# Altium footprint library Angler.PcbLib: 331 footprints (part 13 of 21)
Each footprint in its own frame and in the unit in brackets; x right, y up, seen from the top. Pads: shape width x height; smd on the part's side, far side on the other; paste and mask are expansions set on the pad; w line width, h text height; cw(c..) or ccw(c..) is an arc to the next point about the centre after c.
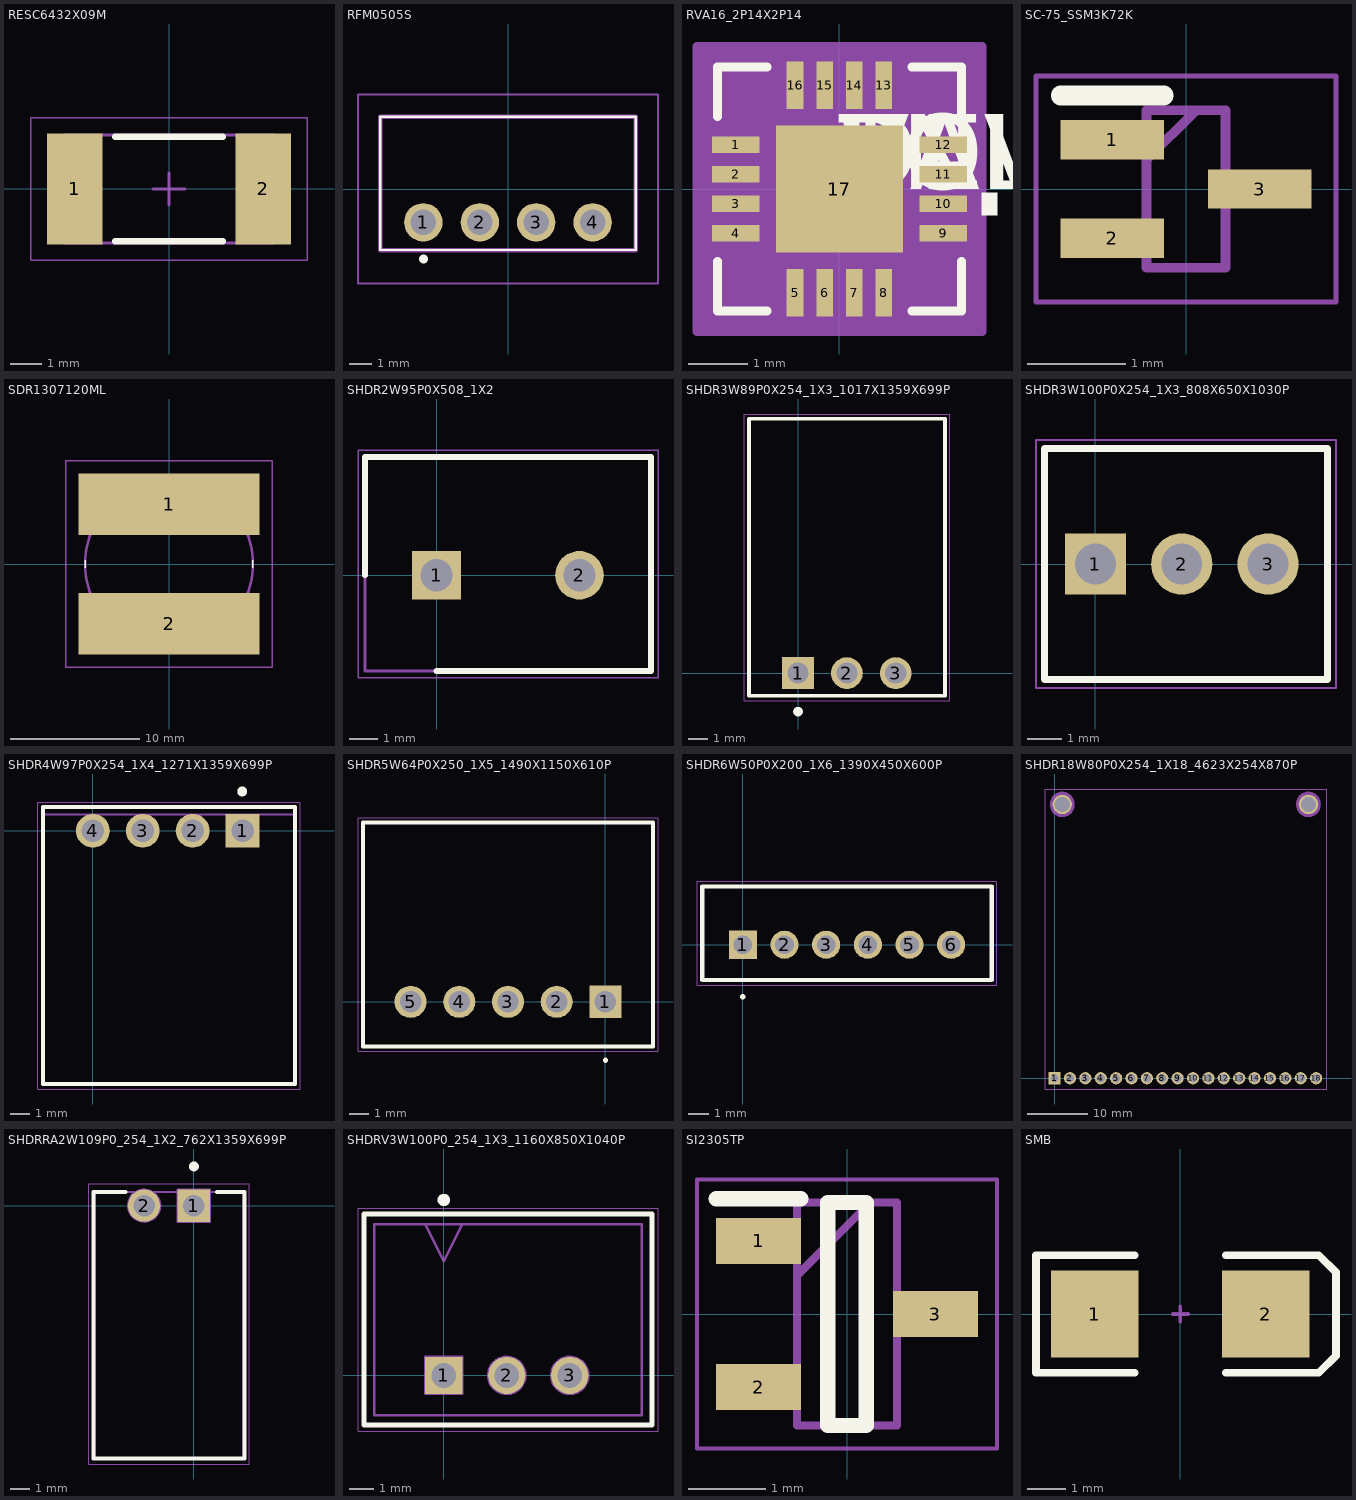
[diagram p12: the footprints below, top view; thin cyan lines are the x and y axes]

## RESC6432X09M [mm] "Chip Resistor, 2-Leads, Body 6.40x3.20mm, IPC Low Density (2512)"
height 0.9
pads (2):
  rect 1.75x3.5 smd: 1(-2.975,0) 2(2.975,0)
Top Overlay:
  lines w0.2: -1.7,-1.65 1.7,-1.65 ; -1.7,1.65 1.7,1.65
Mechanical 13:
  lines w0.1: -3.3,-1.7 3.3,-1.7 3.3,1.7 -3.3,1.7 -3.3,-1.7
Mechanical 15:
  lines w0.05: -4.35,-2.25 4.35,-2.25 4.35,2.25 -4.35,2.25 -4.35,-2.25
  lines w0.1: -0.5,0 0.5,0 ; 0,-0.5 0,0.5
3D body "RESC6432X09M.step": height 0.9, standoff 0, extent -3.3,-1.7 3.3,1.7

## RFM0505S [mm]
pads (4):
  round 1.725 hole 1.15: 1(-3.81,-1.5) 2(-1.27,-1.5) 3(1.27,-1.5) 4(3.81,-1.5)
Top Overlay:
  lines w0.1: -5.75,-2.75 -5.75,3.25 5.75,3.25 5.75,-2.75 -5.75,-2.75
  lines w0.2: -3.9,-3.15 ccw(c-3.8,-3.15) -3.7,-3.15 ccw(c-3.8,-3.15) -3.9,-3.15
Mechanical 13:
  lines w0.2: -5.75,-2.75 -5.75,3.25 5.75,3.25 5.75,-2.75 -5.75,-2.75
Mechanical 15:
  lines w0.1: -6.75,-4.25 -6.75,4.25 6.75,4.25 6.75,-4.25 -6.75,-4.25
3D body "RFM-0505S.stp": height 10, standoff -5, extent -5.75,-2.75 5.75,3.25

## RVA16_2P14X2P14 [mm]
pads (17):
  rect 0.8x0.28 smd paste-0.14: 1(-1.75,0.75) 2(-1.75,0.25) 3(-1.75,-0.25) 4(-1.75,-0.75) 9(1.75,-0.75) 10(1.75,-0.25) 11(1.75,0.25) 12(1.75,0.75)
  rect 0.28x0.8 smd paste-0.14: 5(-0.75,-1.75) 6(-0.25,-1.75) 7(0.25,-1.75) 8(0.75,-1.75) 13(0.75,1.75) 14(0.25,1.75) 15(-0.25,1.75) 16(-0.75,1.75)
  rect 2.14x2.14 smd paste-1.057 mask-1.054: 17(0,0)
Top Overlay:
  region: 2.404,-0.059 2.658,-0.059 2.658,-0.44 2.404,-0.44
  lines w0.152: -2.057,-1.223 -2.057,-2.057 -1.223,-2.057 ; -2.057,1.223 -2.057,2.057 -1.223,2.057 ; 1.223,-2.057 2.057,-2.057 2.057,-1.223 ; 1.223,2.057 2.057,2.057 2.057,1.223
  text "TOL" at 0,0 h1.27
  text "VAL" at 0,0 h1.27
  text "DEV" at 0,0 h1.27
  text "PN" at 0,0 h1.27
Top Paste:
  region: 0.995,-0.494 0.635,-0.494 0.494,-0.635 0.494,-0.995 0.995,-0.995
  region: 0.995,0.294 0.635,0.294 0.494,0.152 0.494,-0.152 0.635,-0.294 0.995,-0.294
  region: 0.995,0.995 0.494,0.995 0.494,0.635 0.635,0.494 0.995,0.494
  region: 0.152,-0.494 -0.152,-0.494 -0.294,-0.635 -0.294,-0.995 0.294,-0.995 0.294,-0.635
  region: 0.152,0.294 -0.152,0.294 -0.294,0.152 -0.294,-0.152 -0.152,-0.294 0.152,-0.294 0.294,-0.152 0.294,0.152
  region: 0.294,0.995 -0.294,0.995 -0.294,0.635 -0.152,0.494 0.152,0.494 0.294,0.635
  region: -0.635,-0.494 -0.995,-0.494 -0.995,-0.995 -0.494,-0.995 -0.494,-0.635
  region: -0.635,0.294 -0.995,0.294 -0.995,-0.294 -0.635,-0.294 -0.494,-0.152 -0.494,0.152
  region: -0.494,0.995 -0.995,0.995 -0.995,0.494 -0.635,0.494 -0.494,0.635
  region: -0.635,2.125 -0.865,2.125 -0.865,1.375 -0.635,1.375
  region: -0.135,2.125 -0.365,2.125 -0.365,1.375 -0.135,1.375
  region: 0.365,2.125 0.135,2.125 0.135,1.375 0.365,1.375
  region: 0.865,2.125 0.635,2.125 0.635,1.375 0.865,1.375
  region: 2.125,0.865 1.375,0.865 1.375,0.635 2.125,0.635
  region: 2.125,0.365 1.375,0.365 1.375,0.135 2.125,0.135
  region: 2.125,-0.135 1.375,-0.135 1.375,-0.365 2.125,-0.365
  region: 2.125,-0.635 1.375,-0.635 1.375,-0.865 2.125,-0.865
  region: 0.865,-1.375 0.635,-1.375 0.635,-2.125 0.865,-2.125
  region: 0.365,-1.375 0.135,-1.375 0.135,-2.125 0.365,-2.125
  region: -0.135,-1.375 -0.365,-1.375 -0.365,-2.125 -0.135,-2.125
  region: -0.635,-1.375 -0.865,-1.375 -0.865,-2.125 -0.635,-2.125
  region: -1.375,-0.635 -2.125,-0.635 -2.125,-0.865 -1.375,-0.865
  region: -1.375,-0.135 -2.125,-0.135 -2.125,-0.365 -1.375,-0.365
  region: -1.375,0.365 -2.125,0.365 -2.125,0.135 -1.375,0.135
  region: -1.375,0.865 -2.125,0.865 -2.125,0.635 -1.375,0.635
Top Solder:
  region: 0.594,-1.134 0.594,1.134 1.134,1.134 1.134,-1.134
  region: 0.194,-1.134 0.194,1.134 -0.194,1.134 -0.194,-1.134
  region: -1.134,-1.134 -1.134,1.134 -0.594,1.134 -0.594,-1.134
  region: -1.134,-1.134 -1.134,-0.594 1.134,-0.594 1.134,-1.134
  region: -1.134,-0.194 -1.134,0.194 1.134,0.194 1.134,-0.194
  region: -1.134,0.594 -1.134,1.134 1.134,1.134 1.134,0.594
  region: -0.54,2.22 -0.96,2.22 -0.96,1.28 -0.54,1.28
  region: -0.04,2.22 -0.46,2.22 -0.46,1.28 -0.04,1.28
  region: 0.46,2.22 0.04,2.22 0.04,1.28 0.46,1.28
  region: 0.96,2.22 0.54,2.22 0.54,1.28 0.96,1.28
  region: 2.22,0.96 1.28,0.96 1.28,0.54 2.22,0.54
  region: 2.22,0.46 1.28,0.46 1.28,0.04 2.22,0.04
  region: 2.22,-0.04 1.28,-0.04 1.28,-0.46 2.22,-0.46
  region: 2.22,-0.54 1.28,-0.54 1.28,-0.96 2.22,-0.96
  region: 0.96,-1.28 0.54,-1.28 0.54,-2.22 0.96,-2.22
  region: 0.46,-1.28 0.04,-1.28 0.04,-2.22 0.46,-2.22
  region: -0.04,-1.28 -0.46,-1.28 -0.46,-2.22 -0.04,-2.22
  region: -0.54,-1.28 -0.96,-1.28 -0.96,-2.22 -0.54,-2.22
  region: -1.28,-0.54 -2.22,-0.54 -2.22,-0.96 -1.28,-0.96
  region: -1.28,-0.04 -2.22,-0.04 -2.22,-0.46 -1.28,-0.46
  region: -1.28,0.46 -2.22,0.46 -2.22,0.04 -1.28,0.04
  region: -1.28,0.96 -2.22,0.96 -2.22,0.54 -1.28,0.54
Mechanical 13:
  text "RefDes2" at 0,0 h1.27
Mechanical 15:
  region: 2.404,-2.404 -2.404,-2.404 -2.404,2.404 2.404,2.404
  lines w0.152: -2.404,-2.404 2.404,-2.404 2.404,2.404 -2.404,2.404 -2.404,-2.404
3D body "RVA16_2P14X2P14.stp": height 1.4, standoff 0, extent -1.854,-1.854 1.854,1.854

## SC-75_SSM3K72K [mm]
height 0.7
pads (3):
  rect 1.05x0.4 smd: 1(-0.75,0.5) 2(-0.75,-0.5) 3(0.75,0)
Top Overlay:
  lines w0.2: -1.275,0.95 -0.225,0.95
Mechanical 13:
  lines w0.1: -0.4,0.3 0.1,0.8 ; -0.4,-0.8 0.4,-0.8 0.4,0.8 -0.4,0.8 -0.4,-0.8
Mechanical 15:
  lines w0.05: -1.525,-1.15 1.525,-1.15 1.525,1.15 -1.525,1.15 -1.525,-1.15
3D body "PMR280UN,115.stp": height 0.95, standoff 0, extent -0.8,-0.8 0.8,0.8

## SDR1307120ML [mm]
pads (2):
  rect 14x4.75 smd: 1(0,4.625) 2(0,-4.625)
Top Overlay:
  lines w0.1: -6.5,-0.3 -6.5,0.3 ; 6.5,-0.3 6.5,0.3
Mechanical 13:
  lines w0.2: -6.5,0 ccw(c0,0) 6.5,0 ccw(c0,0) -6.5,0
Mechanical 15:
  lines w0.1: -8,-8 -8,8 8,8 8,-8 -8,-8
3D body "SDR1307_colour.STP": height 7, standoff 0, extent -6.5,-6.5 6.5,6.5

## SHDR2W95P0X508_1X2 [mm]
height 10
pads (2):
  rect 1.725x1.725 hole 1.15: 1(0,0)
  round 1.725 hole 1.15: 2(5.08,0)
Top Overlay:
  lines w0.2: -2.54,0 -2.54,4.2 7.62,4.2 7.62,-3.4 0,-3.4
Mechanical 13:
  lines w0.1: -2.54,-3.4 -2.54,4.2 7.62,4.2 7.62,-3.4 -2.54,-3.4
Mechanical 15:
  lines w0.05: -2.79,-3.65 -2.79,4.45 7.87,4.45 7.87,-3.65 -2.79,-3.65
3D body "1715721.STEP": height 14.2, standoff -3.5, extent -2.551,-5.2 8.351,4.6

## SHDR3W89P0X254_1X3_1017X1359X699P [mm]
pads (3):
  rect 1.65x1.65 hole 1.1: 1(0,0)
  round 1.65 hole 1.1: 2(2.54,0) 3(5.08,0)
Top Overlay:
  circle w0.25: c0,-2 r0.125
  lines w0.2: -2.54,-1.175 -2.54,13.21 7.63,13.21 7.63,-1.175 -2.54,-1.175
Mechanical 13:
  lines w0.1: -2.54,-1.2 7.63,-1.2 7.63,13.21 -2.54,13.21 -2.54,-1.175
Mechanical 15:
  lines w0.05: -2.79,-1.425 7.88,-1.425 7.88,13.46 -2.79,13.46 -2.79,-1.425
3D body "70553-0002.stp": height 7.06, standoff -3.22, extent -2.56,-0.7 7.6,12.889

## SHDR3W100P0X254_1X3_808X650X1030P [mm]
pads (3):
  rect 1.8x1.8 hole 1.2: 1(0,0)
  round 1.8 hole 1.2: 2(2.54,0) 3(5.08,0)
Top Overlay:
  lines w0.2: -1.5,-3.4 6.83,-3.4 6.83,3.4 -1.5,3.4 -1.5,-3.4
Mechanical 13:
  lines w0.1: -1.5,-3.4 -1.5,3.4 6.83,3.4 6.83,-3.4 -1.5,-3.4
Mechanical 15:
  lines w0.05: -1.75,-3.65 -1.75,3.65 7.08,3.65 7.08,-3.65 -1.75,-3.65
3D body "282834-3.stp": height 10, standoff -3.4, extent -1.5,-3.25 6.58,3.25

## SHDR4W97P0X254_1X4_1271X1359X699P [mm]
pads (4):
  rect 1.725x1.725 hole 1.15: 1(7.62,0)
  round 1.725 hole 1.15: 2(5.08,0) 3(2.54,0) 4(0,0)
Top Overlay:
  circle w0.25: c7.6,2 r0.125
  lines w0.2: -2.545,1.2 -2.545,-12.895 10.295,-12.895 10.295,1.212 -2.545,1.212
Mechanical 13:
  lines w0.1: -2.545,-12.895 10.295,-12.895 10.295,0.825 -2.545,0.825 -2.545,-12.895
Mechanical 15:
  lines w0.05: -2.795,-13.145 10.545,-13.145 10.545,1.462 -2.795,1.462 -2.795,-13.145
3D body "70553-0003.stp": height 7.06, standoff -3.22, extent -2.55,-12.889 10.15,0.7

## SHDR5W64P0X250_1X5_1490X1150X610P [mm]
pads (5):
  rect 1.65x1.65 hole 1.1: 1(0,0)
  round 1.65 hole 1.1: 2(-2.5,0) 3(-5,0) 4(-7.5,0) 5(-10,0)
Top Overlay:
  circle w0.254: c-0.002,-3 r0.002
  lines w0.2: -12.45,-2.3 2.45,-2.3 2.45,9.2 -12.45,9.2 -12.45,-2.3
Mechanical 13:
  lines w0.1: -12.45,-2.3 2.45,-2.3 2.45,9.2 -12.45,9.2 -12.45,-2.3
Mechanical 15:
  lines w0.05: -12.7,-2.55 2.7,-2.55 2.7,9.45 -12.7,9.45 -12.7,-2.55
3D body "S5B-XH-A.STEP": height 6.15, standoff -3.4, extent -12.45,-2.35 2.45,9.15

## SHDR6W50P0X200_1X6_1390X450X600P [mm]
pads (6):
  rect 1.35x1.35 hole 0.9: 1(0,0)
  round 1.35 hole 0.9: 2(2,0) 3(4,0) 4(6,0) 5(8,0) 6(10,0)
Top Overlay:
  circle w0.254: c0,-2.5 r0.002
  lines w0.2: -1.95,-1.7 11.95,-1.7 11.95,2.8 -1.95,2.8 -1.95,-1.7
Mechanical 13:
  lines w0.1: -1.95,-1.7 -1.95,2.8 11.95,2.8 11.95,-1.7 -1.95,-1.7
Mechanical 15:
  lines w0.05: -2.2,-1.95 -2.2,3.05 12.2,3.05 12.2,-1.95 -2.2,-1.95
3D body "B6B-PH-K-S.STEP": height 6, standoff -3.4, extent -2,-1.65 11.9,2.85

## SHDR18W80P0X254_1X18_4623X254X870P [mm]
pads (20):
  rect 2.025x2.025 hole 1.35: 1(0,0)
  round 2.025 hole 1.35: 2(2.54,0) 3(5.08,0) 4(7.62,0) 5(10.16,0) 6(12.7,0) 7(15.24,0) 8(17.78,0) 9(20.32,0) 10(22.86,0) 11(25.4,0) 12(27.94,0) 13(30.48,0) 14(33.02,0) 15(35.56,0) 16(38.1,0) 17(40.64,0) 18(43.18,0)
  round 3.2 hole 2.5: ""(1.27,45.212) ""(41.91,45.212)
Mechanical 2:
  circle w0.203: c41.91,45.212 r2
  circle w0.203: c1.27,45.212 r2
Mechanical 13:
  lines w0.1: -1.52,-1.778 44.92,-1.778 44.92,47.752 -1.52,47.752 -1.52,-1.778
Mechanical 34:
  circle w2.032: c41.91,45.212 r1
  circle w2.032: c1.27,45.212 r1
Mechanical 35:
  circle w2.032: c41.91,45.212 r1
  circle w2.032: c1.27,45.212 r1
3D body "ADAFRUIT.step": height 10.16, standoff 8.57, extent -1.295,-1.829 44.425,47.701
3D body "_ _ _C181LFBN-RC.STEP": height 8.5, standoff -3.2, extent -1.52,-1.27 44.7,1.27

## SHDRRA2W109P0_254_1X2_762X1359X699P [mm]
pads (2):
  rect 1.65x1.65 hole 1.1: 1(0,0)
  round 1.65 hole 1.1: 2(-2.54,0)
Top Overlay:
  circle w0.25: c0,2 r0.125
  lines w0.2: -3.48,0.705 -5.12,0.705 -5.12,-12.895 2.58,-12.895 2.58,0.705 1.175,0.705
Mechanical 13:
  circle w0.1: c-2.54,0 r0.825
  lines w0.1: -0.825,0.7 0,0.225 0.825,0.7 ; -5.08,-12.89 -5.08,0.7 2.54,0.7 2.54,-12.89 -5.08,-12.89 ; -0.825,-0.825 0.825,-0.825 0.825,0.825 -0.825,0.825 -0.825,-0.825
Mechanical 15:
  circle w0.05: c0,0 r0.35
  lines w0.001: -5.08,-12.89 -5.08,0.7 2.54,0.7 2.54,-12.89 -5.08,-12.89
  lines w0.05: -0.5,0 0.5,0 ; 0,-0.5 0,0.5 ; -5.37,-13.183 -5.37,1.118 2.83,1.118 2.83,-13.183 -5.37,-13.183
3D body "70553-0001.stp": height 7.06, standoff -3.22, extent -4.966,-12.889 2.4,0.7

## SHDRV3W100P0_254_1X3_1160X850X1040P [mm]
pads (3):
  rect 1.5x1.5 hole 1: 1(0,0)
  round 1.5 hole 1: 2(2.54,0) 3(5.08,0)
Top Overlay:
  circle w0.25: c0,7.075 r0.125
  lines w0.2: -3.21,-2 -3.21,6.5 8.39,6.5 8.39,-2 -3.21,-2
Mechanical 13:
  circle w0.1: c5.08,0 r0.75
  circle w0.1: c2.54,0 r0.75
  lines w0.1: -0.75,6.1 0,4.6 0.75,6.1 ; -3.21,-2 -3.21,6.5 8.39,6.5 8.39,-2 -3.21,-2 ; -2.81,-1.6 -2.81,6.1 7.99,6.1 7.99,-1.6 -2.81,-1.6 ; -0.75,-0.75 0.75,-0.75 0.75,0.75 -0.75,0.75 -0.75,-0.75
Mechanical 15:
  circle w0.05: c0,0 r0.35
  lines w0.001: -3.21,-2 -3.21,6.5 8.39,6.5 8.39,-2 -3.21,-2
  lines w0.05: -0.5,0 0.5,0 ; 0,-0.5 0,0.5 ; -3.46,-2.25 -3.46,6.75 8.64,6.75 8.64,-2.25 -3.46,-2.25
3D body "R-78E5.0-0.5--3DModel-STEP-56544.STEP": height 10.4, standoff -4.1, extent -3.26,-2.09 8.34,6.41

## SI2305TP [mm]
pads (3):
  rect 1.1x0.6 smd: 1(-1.15,0.95) 2(-1.15,-0.95) 3(1.15,0)
Top Overlay:
  lines w0.2: -1.7,1.5 -0.6,1.5 ; -0.25,-1.45 0.25,-1.45 0.25,1.45 -0.25,1.45 -0.25,-1.45
Mechanical 13:
  lines w0.1: -0.65,0.5 0.3,1.45 ; -0.65,-1.45 0.65,-1.45 0.65,1.45 -0.65,1.45 -0.65,-1.45
Mechanical 15:
  lines w0.05: -1.95,-1.75 1.95,-1.75 1.95,1.75 -1.95,1.75 -1.95,-1.75
3D body "BSS138NH6327.stp": height 1.1, standoff 0, extent -1.3,-1.45 1.3,1.45

## SMB [mm] "DO-214-AA/SMB; 2 C-Bend Leads; Body 5.3 x 3.6 mm, inc. leads (LxW)"
height 2.54
pads (2):
  rect 2.3x2.3 smd: 1(-2.25,0) 2(2.25,0)
Top Overlay:
  lines w0.2: -1.2,-1.55 -3.8,-1.55 -3.8,1.55 -1.2,1.55 ; 1.2,-1.55 3.65,-1.55 4.1,-1.1 4.1,1.1 3.65,1.55 1.2,1.55
Mechanical 1:
  lines w0.1: -0.2,0 0.2,0 ; 0,-0.2 0,0.2